# Altium footprint library PcbLib1.PcbLib: 19 footprints (part 2 of 2)
Each footprint in its own frame and in the unit in brackets; x right, y up, seen from the top. Pads: shape width x height; smd on the part's side, far side on the other; paste and mask are expansions set on the pad; w line width, h text height; cw(c..) or ccw(c..) is an arc to the next point about the centre after c.
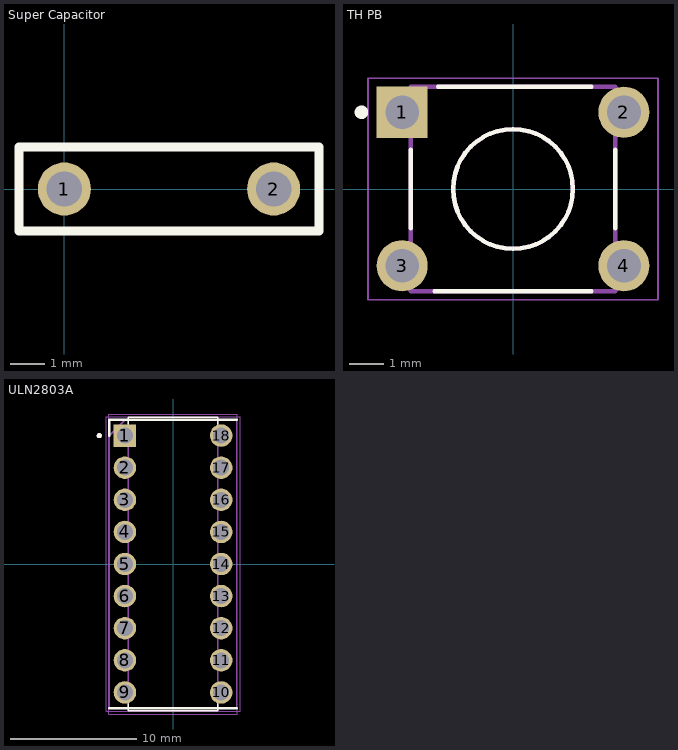
[diagram p1: the footprints below, top view; thin cyan lines are the x and y axes]

## Super Capacitor [mil]
pads (2):
  round 60 hole 40: 1(0,0) 2(236.22,0)
Top Overlay:
  lines w10: -51.18,-47.24 287.4,-47.24 287.4,47.24 -51.18,47.24 -51.18,-47.24
3D body: height 1023.62, standoff 157.48, extent -4,-414.07 232.22,452.07

## TH PB [mm]
pads (4):
  rect 1.498x1.498 / inner round 1.498 / far side rect 1.498x1.498 hole 0.99: 1(-3.25,2.25)
  round 1.498 hole 0.99: 2(3.25,2.25) 3(-3.25,-2.25) 4(3.25,-2.25)
Top Overlay:
  circle w0.2: c-4.445,2.25 r0.1
  circle w0.127: c0,0 r1.755
  lines w0.127: -2.995,-1.15 -2.995,1.15 ; -2.3,-2.995 2.3,-2.995 ; -2.2,2.995 2.3,2.995 ; 3,-1.15 3,1.15
Mechanical 13:
  circle w0.127: c0,0 r1.755
  lines w0.127: -2.995,-2.995 2.995,-2.995 2.995,2.995 -2.995,2.995 -2.995,-2.995
Mechanical 15:
  lines w0.05: -4.25,-3.25 4.25,-3.25 4.25,3.25 -4.25,3.25 -4.25,-3.25
3D body "step_temp.STEP": height 5.01, standoff -3.51, extent -3.9,-2.995 3.898,2.995

## ULN2803A [mil]
height 154.72
pads (18):
  rect 70x70 hole 50: 1(-150,400)
  round 70 hole 50: 2(-150,300) 3(-150,200) 4(-150,100) 5(-150,0) 6(-150,-100) 7(-150,-200) 8(-150,-300) 9(-150,-400) 10(150,-400) 11(150,-300) 12(150,-200) 13(150,-100) 14(150,0) 15(150,100) 16(150,200) 17(150,300) 18(150,400)
Top Overlay:
  circle w7.87: c-229.88,400 r3.94
  lines w5: -139.76,-435.79 -139.76,-457.48 139.76,-457.48 139.76,-435.79 ; -139.76,435.79 -139.76,457.48 139.76,457.48 139.76,435.79
  lines w7.87: -198.82,-448.82 198.82,-448.82 ; -198.82,400 -198.82,448.82 198.82,448.82
Mechanical 13:
  circle w7.87: c-229.88,400 r3.94
  lines w3.94: -198.82,398.82 -148.82,448.82 ; -198.82,-448.82 198.82,-448.82 198.82,448.82 -198.82,448.82 -198.82,-448.82
  lines w5: -139.76,-457.48 -139.76,457.48 139.76,457.48 139.76,-457.48 -139.76,-457.48
Mechanical 15:
  lines w1.97: -208.66,-458.66 208.66,-458.66 208.66,458.66 -208.66,458.66 -208.66,-458.66 ; -200.35,-467.32 200.35,-467.32 200.35,467.32 -200.35,467.32 -200.35,-467.32
3D body "step_temp.STEP": height 304.72, standoff 20.08, extent -172.24,-457.48 172.24,457.48
3D body "110-99-318-41-001000.stp": height 159.84, standoff -130.31, extent -198.82,-448.82 198.82,448.82